# Altium integrated library Transformer.IntLib: 86 symbols
Pins are listed as number, name and electrical type; pins without a type are passive.

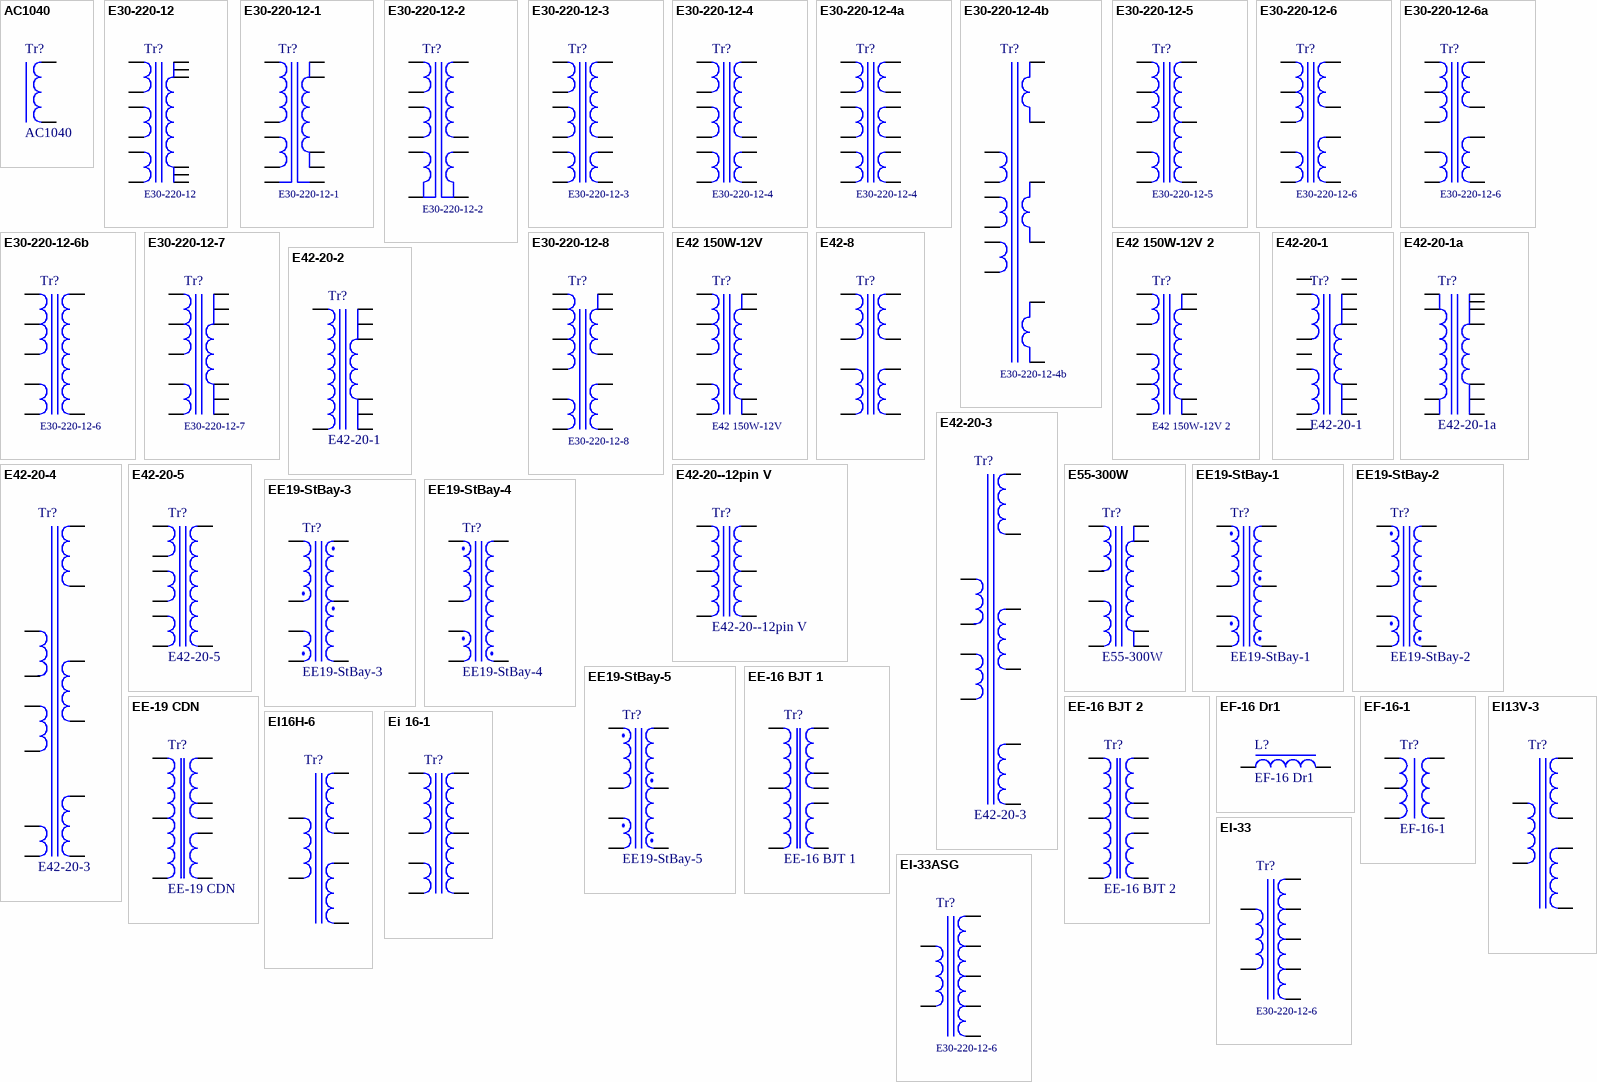
[diagram p0: symbols AC1040 to EI-33ASG]

## AC1040
designator Tr?
Price: 7.6
footprint AC1040
pins: 1, 2

## E30-220-12
designator Tr?
footprint E30-12
pins: 1, 2, 3, 4, 5, 6, 7, 8, 9, 10, 11, 12

## E30-220-12-1
designator Tr?
footprint E30-12
pins: 2, 3, 4, 5, 6, 9, 10, 11, 12, 13

## E30-220-12-2
designator Tr?
footprint E30-12
pins: 1, 2, 3, 4, 5, 6, 7, 8, 9, 10, 11, 12

## E30-220-12-3
designator Tr?
footprint E30-12
pins: 1, 2, 3, 4, 5, 6, 7, 8, 9, 10, 11, 12

## E30-220-12-4
designator Tr?
footprint E30-12
pins: 1, 2, 3, 4, 5, 6, 7, 8, 9, 10, 11, 12

## E30-220-12-4a
designator Tr?, comment E30-220-12-4
footprint E30-12
pins: 1, 2, 3, 4, 5, 6, 7, 8, 9, 10, 11, 12

## E30-220-12-4b
designator Tr?
footprint E30-12
pins: 1, 2, 3, 4, 5, 6, 7, 8, 9, 10, 11, 12

## E30-220-12-5
designator Tr?
footprint E30-12
pins: 1, 2, 3, 4, 5, 6, 7, 8, 9, 10, 11, 12

## E30-220-12-6
designator Tr?
footprint E30-12
pins: 1, 2, 3, 4, 5, 6, 7, 8, 9, 10, 11, 12

## E30-220-12-6a
designator Tr?, comment E30-220-12-6
footprint E30-12
pins: 1, 2, 3, 4, 5, 6, 7, 8, 9, 10, 11, 12

## E30-220-12-6b
designator Tr?, comment E30-220-12-6
footprint E30-12
pins: 1, 2, 3, 4, 5, 6, 7, 8, 9, 10, 11, 12

## E30-220-12-7
designator Tr?
footprint E30-12
pins: 1, 2, 3, 4, 5, 6, 7, 8, 9, 10, 11, 12

## E30-220-12-8
designator Tr?
footprint E30-12
pins: 1, 2, 3, 4, 5, 6, 7, 8, 9, 10, 11, 12

## E42 150W-12V
designator Tr?
footprint SP-E 42x15 10Pin
pins: 1, 2, 3, 4, 5, 6, 7, 9, 10

## E42 150W-12V 2
designator Tr?
footprint SP-E 42x15 10Pin
pins: 1, 2, 3, 4, 5, 6, 7, 9, 10

## E42-8
designator Tr?
footprint E42-V-8
pins: 1, 2, 3, 4, 5, 6, 7, 8

## E42-20-1
designator Tr?
Price: 4.7
footprint SP-E 42x20 14Pin
pins: 1, 2, 3, 4, 5, 6, 7, 8, 9, 10, 11, 12, 13, 14

## E42-20-1a
designator Tr?
Price: 4.7
footprint SP-E 42x20 14Pin
pins: 2, 3, 5, 6, 8, 9, 10, 11, 12, 13, 14

## E42-20-2
designator Tr?, comment E42-20-1
Price: 4.7
footprint SP-E 42x20 14Pin
pins: 2, 3, 5, 6, 8, 9, 10, 12, 13, 14

## E42-20-3
designator Tr?
footprint SP-E 42x20 14Pin
pins: 1, 2, 3, 4, 5, 6, 8, 9, 11, 12, 13, 14

## E42-20-4
designator Tr?, comment E42-20-3
footprint SP-E 42x20 14Pin
pins: 1, 2, 3, 4, 5, 6, 8, 9, 11, 12, 13, 14

## E42-20-5
designator Tr?
Price: 4.7
footprint SP-E 42x20 14Pin
pins: 1, 2, 3, 4, 5, 6, 8, 9, 10, 11, 12, 13, 14

## E42-20--12pin V
designator Tr?
Price: 4.7
footprint SP-E 42x20 14Pin
pins: 1, 2, 3, 4, 5, 6, 7, 8, 9, 10, 11, 12, 13, 14

## E55-300W
designator Tr?
Price: 4.7
footprint E55-h
pins: 1, 2, 3, 4, 5, 6, 7, 8

## EE19-StBay-1
designator Tr?
7700-2; Price: 1.5
footprint EE-19 StBay 1
pins: 1, 2, 3, 4, 5, 6, 7

## EE19-StBay-2
designator Tr?
02036; Price: 1.5
footprint EE-19 StBay 1
pins: 1, 2, 3, 4, 5, 6, 7

## EE19-StBay-3
designator Tr?
EE19N 4.24mH 0.5A; Price: 1.5
footprint EE-19 StBay 2
pins: 1, 2, 3, 4, 5, 6, 7

## EE19-StBay-4
designator Tr?
TB-1120T V:2.0; Price: 1.5
footprint EE-19 StBay 3
pins: 1, 2, 4, 5, 6, 7

## EE19-StBay-5
designator Tr?
341500056A01; Price: 1.5
footprint EE-19 StBay 3
pins: 1, 2, 3, 4, 5, 6, 7

## EE-16 BJT 1
designator Tr?
Upr 2xBJT
footprint EE-16 BJT - 1
pins: 1, 2, 3, 4, 5, 6, 7, 8
1 alternate drawing of the same symbol

## EE-16 BJT 2
designator Tr?
Upr 2xBJT
footprint EE-16 BJT - 1
footprint EE-16 BJT - 2
pins: 1, 2, 3, 4, 5, 6, 7, 8
1 alternate drawing of the same symbol

## EE-19 CDN
designator Tr?
Upr 2xBJT
footprint EE-19 CDN
pins: 1, 2, 3, 4, 5, 6, 7, 8

## EF-16 Dr1
designator L?
Price: 1.5
footprint EF16-6
pins: 1, 6

## EF-16-1
designator Tr?
Price: 1.5
footprint EF16-6
pins: 1, 2, 3, 4, 6

## EI13V-3
designator Tr?
Price: 1.5
footprint EI13-6V
pins: 2, 4, 6, 7, 9, 10

## EI16H-6
designator Tr?
Price: 1.5
footprint EF16-6
pins: 1, 2, 3, 4, 5, 6

## Ei 16-1
designator Tr?
Price: 1.5
footprint EI16-12
pins: 1, 3, 5, 6, 8, 9, 10, 11

## EI-33
designator Tr?, comment E30-220-12-6
footprint EI-33
pins: 1, 2, 3, 4, 5, 6, 7, 8, 9

## EI-33ASG
designator Tr?, comment E30-220-12-6
footprint EI-33
pins: 1, 2, 3, 4, 5, 6, 7, 8, 9

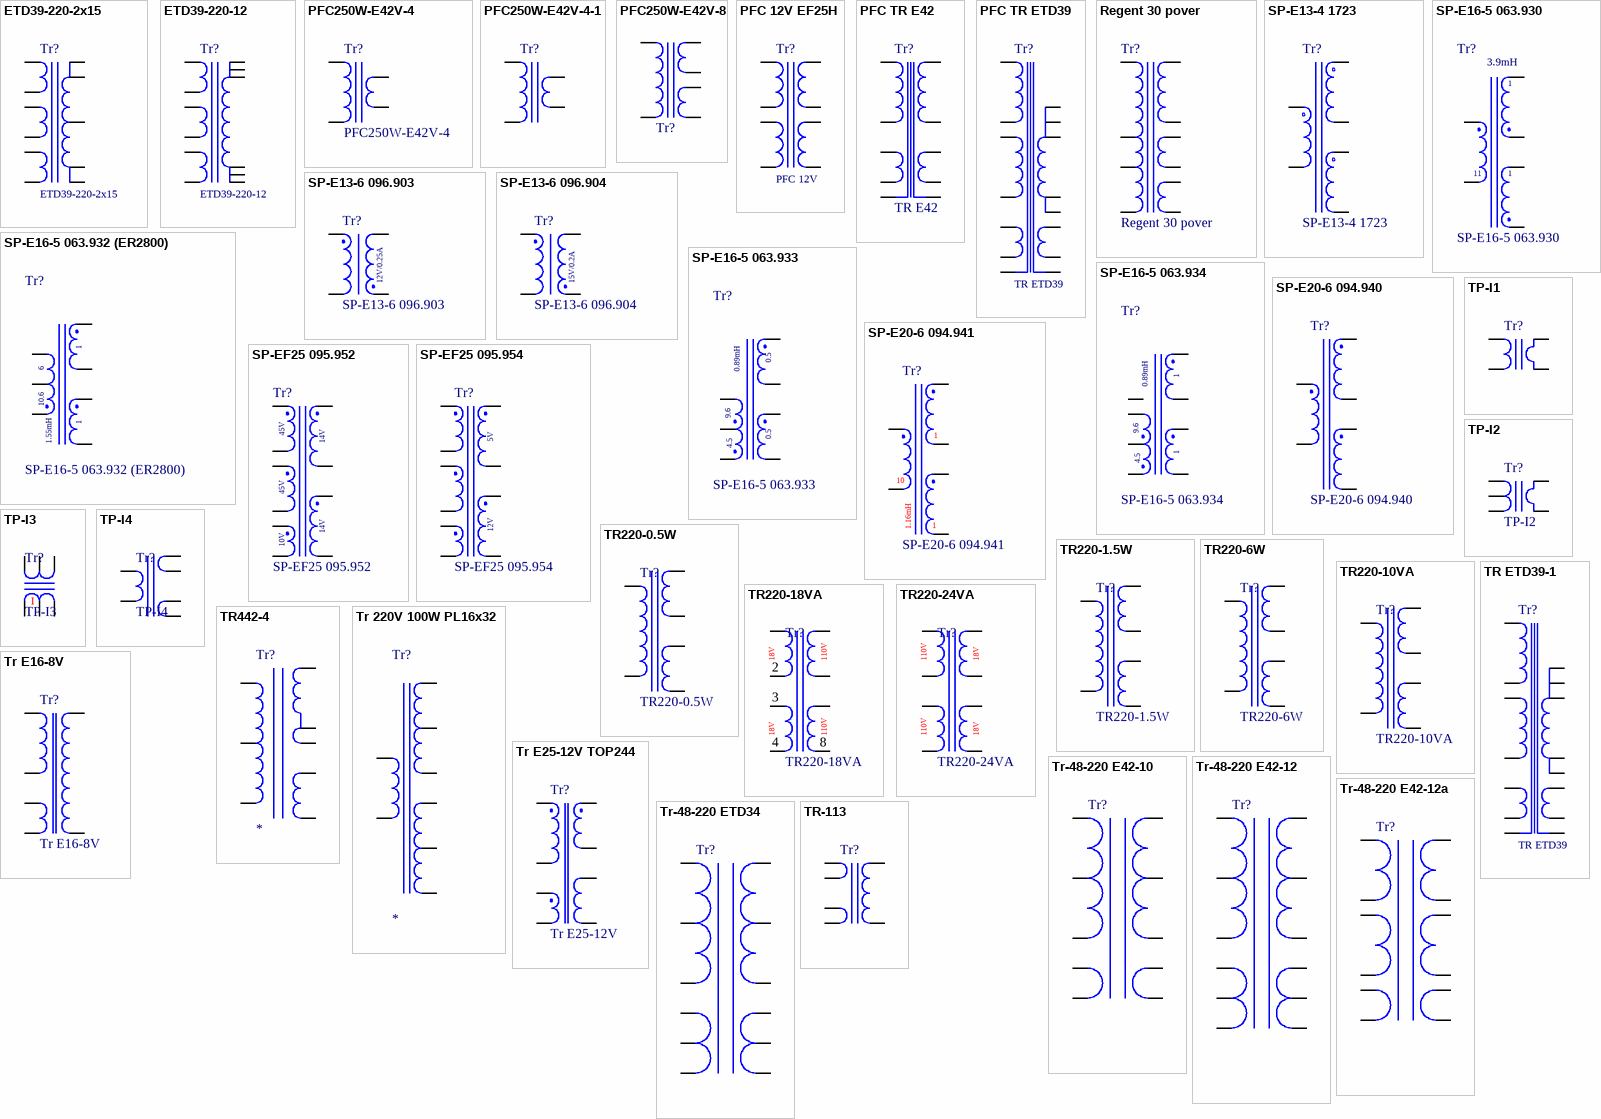
[diagram p1: symbols ETD39-220-2x15 to TR-113]

## ETD39-220-2x15
designator Tr?
footprint ETD39 16pin
pins: 2, 3, 4, 5, 6, 7, 10, 11, 12, 13, 14, 15

## ETD39-220-12
designator Tr?
footprint ETD39 16pin
pins: 2, 3, 4, 5, 6, 7, 10, 11, 12, 13, 14, 15

## PFC250W-E42V-4
designator Tr?
footprint E42-V-4
pins: 1, 2, 3, 4

## PFC250W-E42V-4-1
designator Tr?
footprint E42-V-4
pins: 1, 2, 3, 4

## PFC250W-E42V-8
designator Tr?
footprint E42-V-8
pins: 1, 2, 3, 4, 6, 7

## PFC 12V EF25H
designator Tr?, comment PFC 12V
footprint EF25H
pins: 1, 2, 3, 4, 5, 6, 7, 8

## PFC TR E42
designator Tr?, comment TR E42
footprint E42-h
pins: 1, 2, 3, 4, 5, 6, 7, 8, 9, 10

## PFC TR ETD39
designator Tr?, comment TR ETD39
footprint ETD39 16pin
pins: 1, 2, 3, 4, 6, 7, 8, 9, 10, 11, 12, 13, 14, 15, 16

## Regent 30 pover
designator Tr?
pins: 1, 2, 3, 4, 5, 7, 8, 10, 12, 15

## SP-E13-4 1723
designator Tr?
Price: 1.5
footprint SP-E 13x4 10pin
pins: 2, 4, 6, 7, 9, 10

## SP-E13-6 096.903
designator Tr?
3W-12V-0.25A LKN501 3.36mH*; Price: 1.8
footprint SP-E 13-6 - 096-904
pins: 1, 4, 5, 8
text: 12V/0.25A

## SP-E13-6 096.904
designator Tr?
3W-15V-0.2A LKN501 2.8mH*; Price: 1.8
footprint SP-E 13-6 - 096-904
pins: 1, 4, 5, 8
text: 15V/0.2A

## SP-E16-5 063.930
designator Tr?
6W-2x12V 0.25A TNY263 3.9mH; Price: 2
footprint SP-E 16-5 - 063-929-30
pins: 1, 2 hidden, 3 hidden, 4, 5, 6, 7, 8
text: 3.9mH; 11

## SP-E16-5 063.932 (ER2800)
designator Tr?
6W-2x12V-0.25A TNY265 1.55mH*; Price: 2
footprint SP-E 16-5 - 063-931-4
pins: 1, 2, 3 hidden, 4, 5, 6, 7, 8
text: 10.6; 1.55mH

## SP-E16-5 063.933
designator Tr?
9W-2x6V-0.75A TNY267 0.89mH*; Price: 2
footprint SP-E 16-5 - 063-931-4
pins: 1, 2, 3 hidden, 4, 5, 6, 7, 8
text: 0.5; 0.89mH; 9.6; 4.5

## SP-E16-5 063.934
designator Tr?
9W-2x12V-0.36A TNY267 0.89mH*; Price: 2
footprint SP-E 16-5 - 063-931-4
pins: 1, 2, 3, 4, 5, 6, 7, 8
text: 0.89mH; 9.6; 4.5

## SP-E20-6 094.940
designator Tr?
18W-2x6V-1.5A-TNY268 1.16mH; Price: 2
footprint SP-E 20-6 - 094-941
pins: 1 hidden, 3, 4, 6 hidden, 7, 9, 12, 14

## SP-E20-6 094.941
designator Tr?
18W-2x12V-0.75A TNY268 1.16mH*; Price: 2
footprint SP-E 20-6 - 094-941
pins: 1 hidden, 3, 4, 6 hidden, 7, 9, 12, 14
text: 10; 1.16mH

## SP-EF25 095.952
designator Tr?
35W 2x14V-1.25A TOP244 504uH*; Price: 4.1
footprint SP-EF25
pins: 1, 2, 3, 4, 5, 7, 8, 10, 12, 15
text: 45V; 14V; 10V

## SP-EF25 095.954
designator Tr?
34W 5V-2.5A 12V-1.8A TOP244 504uH; Price: 2
footprint SP-EF25
pins: 1, 2, 3, 4, 5, 7, 8, 10, 12, 15
text: 5V; 12V

## TP-I1
designator Tr?
footprint Tr-Tok1
pins: 1, 2, 3, 4

## TP-I2
designator Tr?
footprint Tr-Tok2
pins: 1, 2, 3, 4, 5

## TP-I3
designator Tr?
footprint Tr-Tok3
pins: 1, 2, 3, 4, 5, 6
text: I

## TP-I4
designator Tr?
footprint Tr-Tok3
pins: 1, 2, 3, 4, 5, 6

## TR220-0.5W
designator Tr?
Price: 6
footprint TR220-0.5W
pins: 1, 5, 6, 7, 9, 10

## TR220-1.5W
designator Tr?
Price: 6
footprint TR220-1.5W
pins: 1, 5, 6, 7, 9, 10

## TR220-6W
designator Tr?
2x18V 0.16A; Price: 5.7
footprint TR220-6W
pins: 1, 2 hidden, 3 hidden, 4 hidden, 5, 6, 7, 8 hidden, 9, 10

## TR220-10VA
designator Tr?
Price: 9.66
footprint TR220-10W
pins: 1, 2 hidden, 3 hidden, 4 hidden, 5, 6, 7, 8 hidden, 9, 10

## TR220-18VA
designator Tr?
2x18V 0.38A; Price: 13.6
footprint TR220-18W
pins: 1, 2, 3, 4, 5, 6, 7, 8
text: 18V; 110V

## TR220-24VA
designator Tr?
2x18V 0.66A; Price: 13.6
footprint TR220-24W
pins: 1, 2, 3, 4, 5, 6, 7, 8
text: 110V; 18V

## TR442-4
designator Tr?
pins: 1, 2, 3, 4, 5, 6, 7, 8

## Tr 220V 100W PL16x32
designator Tr?
footprint Tr 220V 100W PL16x32
pins: 1, 2, 3, 4, 5, 6, 7, 9

## Tr E16-8V
designator Tr?
footprint EI16-8V
pins: 1, 2, 3, 4, 5, 6

## Tr E25-12V TOP244
designator Tr?, comment Tr E25-12V
Price: 5.14
footprint SP-E 25x13x7 8pin
pins: 1, 2, 3, 4, 5, 6, 7, 8

## TR ETD39-1
designator Tr?, comment TR ETD39
footprint ETD39 16pin
pins: 1, 2, 3, 4, 6, 7, 8, 9, 10, 11, 12, 13, 14, 15, 16

## Tr-48-220 E42-10
designator Tr?
footprint E42-V-10
pins: 1, 2, 3, 4, 5, 6, 7, 8, 9, 10

## Tr-48-220 E42-12
designator Tr?
footprint E42-V-12a
pins: 1, 2, 3, 4, 5, 6, 7, 8, 9, 10, 11, 12

## Tr-48-220 E42-12a
designator Tr?
footprint E42-V-12a (Footprint not found)
pins: 1, 2, 3, 4, 5, 6, 7, 8, 9, 10, 11, 12

## Tr-48-220 ETD34
designator Tr?
footprint ETD34 14pin
pins: 1, 2, 3, 4, 5, 6, 7, 8, 9, 10, 11, 12, 13, 14

## TR-113
designator Tr?
pins: 1, 2, 3, 4, 5, 6

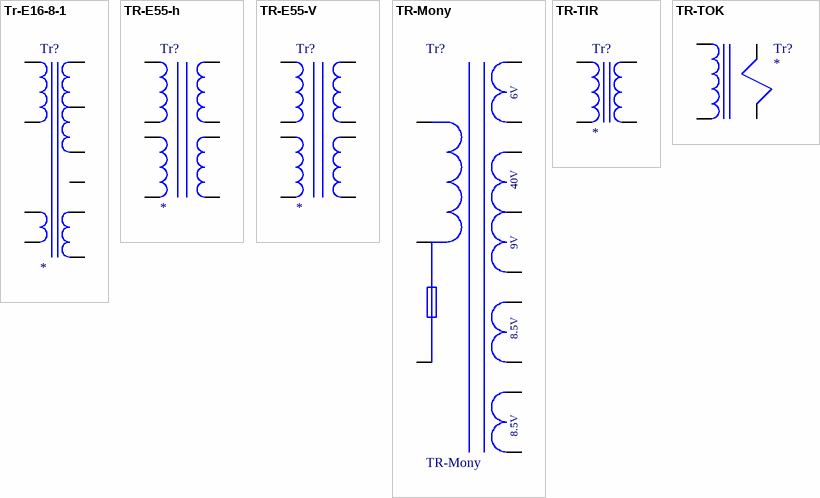
[diagram p2: symbols Tr-E16-8-1 to TR-TOK]

## Tr-E16-8-1
designator Tr?
footprint EI16-12
pins: 1, 3, 5, 6, 7, 8, 9, 10, 11, 12

## TR-E55-h
designator Tr?
footprint E55-h
pins: 1, 2, 3, 4, 5, 6, 7, 8

## TR-E55-V
designator Tr?
footprint E55-V
pins: 1, 2, 3, 4, 5, 6, 7, 8

## TR-Mony
designator Tr?
footprint TR-Mony (Footprint not found)
pins: 1, 2, 3, 4, 5, 6, 7, 8, 9, 10, 11, 12
text: 6V; 40V; 9V; 8.5V

## TR-TIR
designator Tr?
footprint EI13-6V
pins: 1, 3, 4, 6

## TR-TOK
designator Tr?
pins: 1, 2, 3, 4